# Altium footprint library PIFWRobot.PcbLib: 18 footprints (part 2 of 2)
Each footprint in its own frame and in the unit in brackets; x right, y up, seen from the top. Pads: shape width x height; smd on the part's side, far side on the other; paste and mask are expansions set on the pad; w line width, h text height; cw(c..) or ccw(c..) is an arc to the next point about the centre after c.
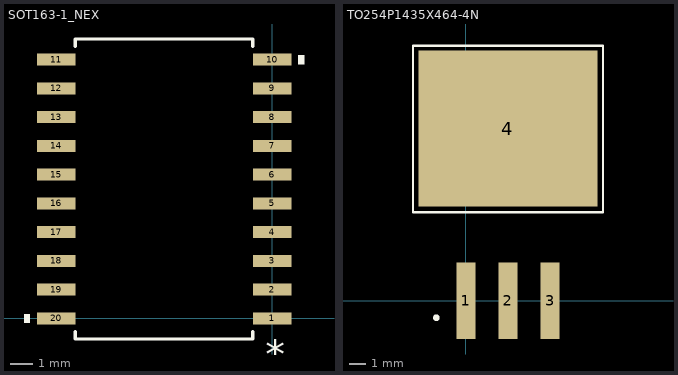
[diagram p1: the footprints below, top view; thin cyan lines are the x and y axes]

## SOT163-1_NEX [mil]
pads (20):
  rect 67x21 smd: 1(0,0) 2(0,50) 3(0,100) 4(0,150) 5(0,200) 6(0,250) 7(0,300) 8(0,350) 9(0,400) 10(0,450) 11(-376,450) 12(-376,400) 13(-376,350) 14(-376,300) 15(-376,250) 16(-376,200) 17(-376,150) 18(-376,100) 19(-376,50) 20(-376,0)
Top Overlay:
  region: 45.5,442.5 55.5,442.5 55.5,457.5 45.5,457.5
  region: -421.5,-7.5 -431.5,-7.5 -431.5,7.5 -421.5,7.5
  lines w6: -342.5,-23.6 -342.5,-36 -33.5,-36 -33.5,-23.6 ; -342.5,473.6 -342.5,486 -33.5,486 -33.5,473.6
  text "*" at 22.5,-16 h50
3D body: height 10, standoff 0, extent -198,215 -188,225
3D body "SOT163-1_NEX.step": height 104.09, standoff 0, extent -397.48,-30.98 21.49,480.98

## TO254P1435X464-4N [mm]
pads (4):
  rect 1.15x4.6 smd: 1(0,0) 2(2.54,0) 3(5.08,0)
  rect 10.8x9.4 smd: 4(2.54,10.375)
Top Overlay:
  circle w0.2: c-1.778,-1.016 r0.1
  lines w0.127: -3.173,5.334 -3.173,15.367 8.255,15.367 8.255,5.334 -3.173,5.334
3D body "DDPAK-TO-263-3.step": height 4.44, standoff 0, extent -2.54,-2.159 7.62,14.491